# Altium integrated library BearPi_RevB01.IntLib: 39 symbols
Pins are listed as number, name and electrical type; pins without a type are passive.

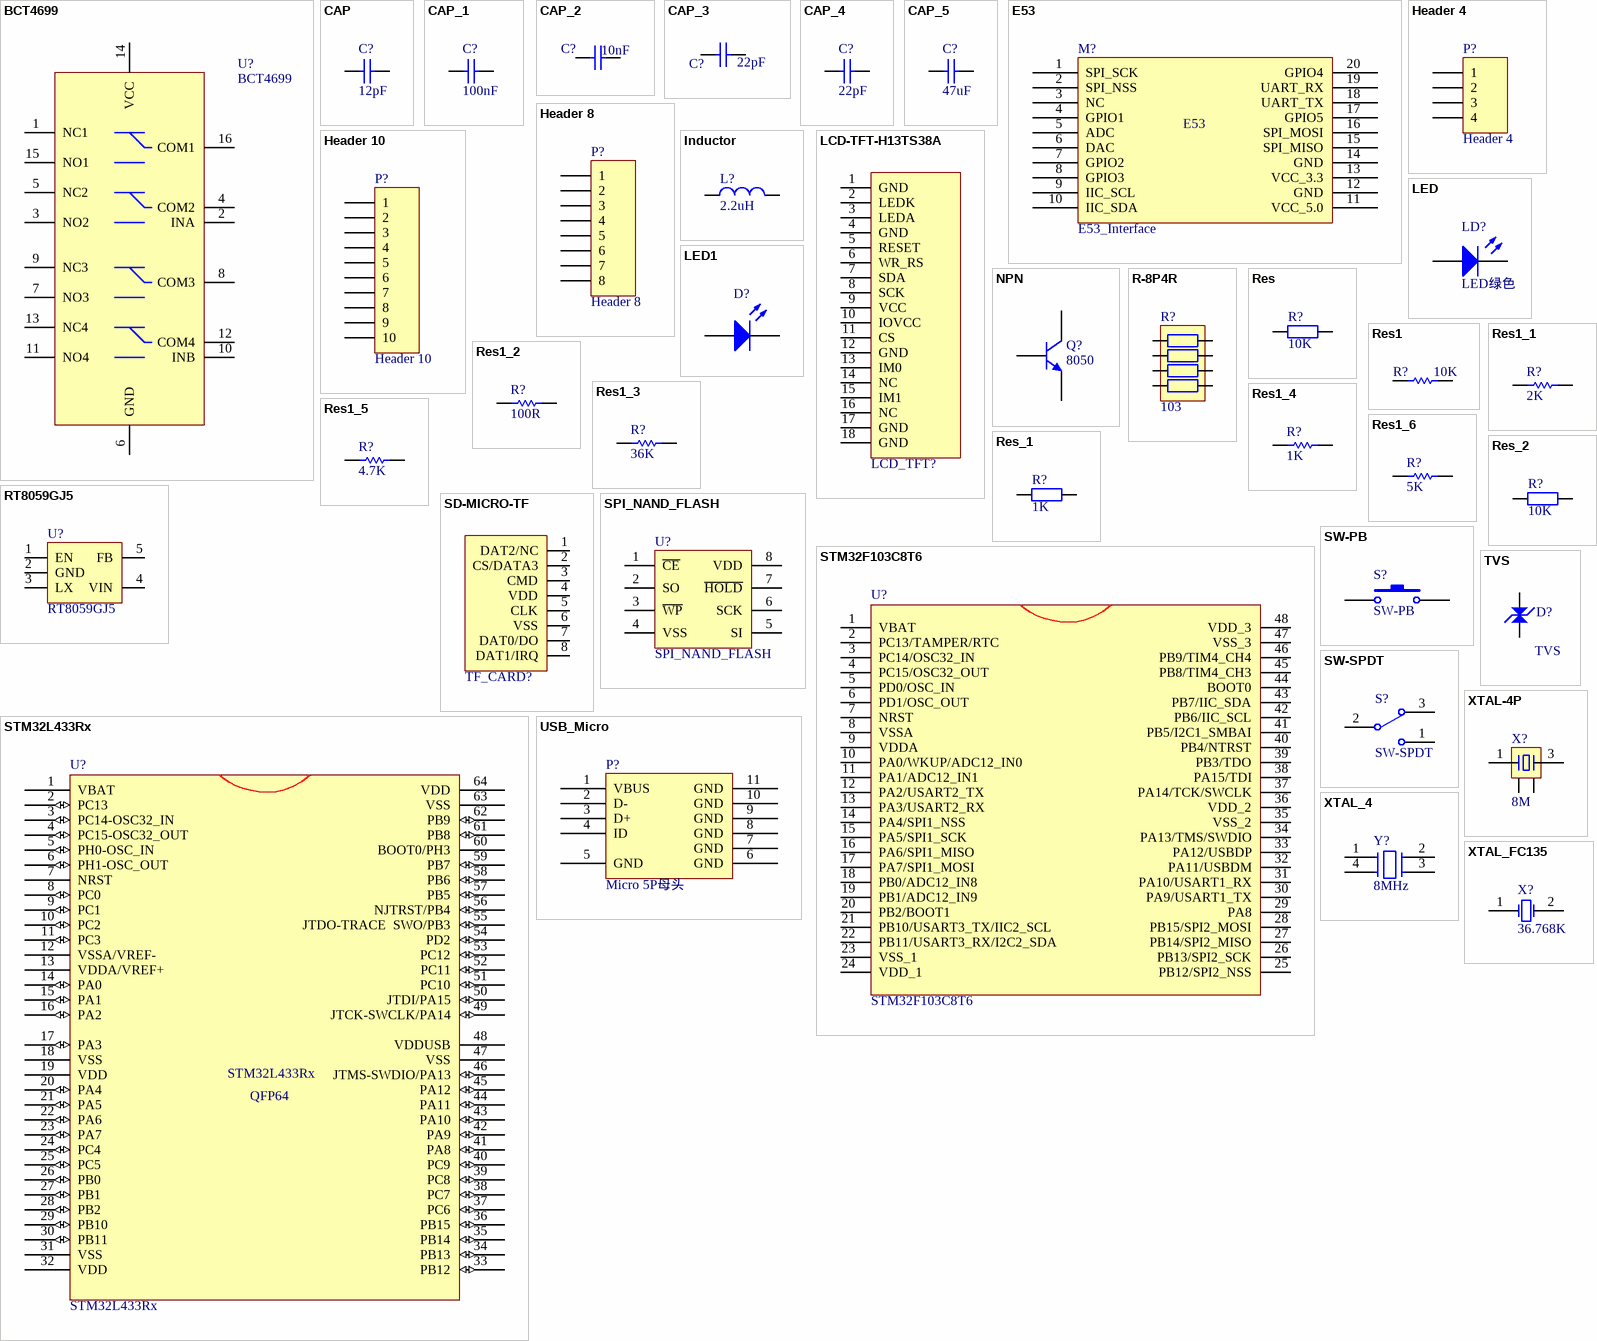
[diagram p0: symbols BCT4699 to XTAL_FC135]

## BCT4699
designator U?
footprint QFN16 (QFN, 16-Leads, Body 3.00x3.00mm, Pitch 0.50mm, Thermal Pad 1.68x1.68mm, IPC Medium Density)
pins: 1 NC1, 2 INA, 3 NO2, 4 COM2, 5 NC2, 6 GND, 7 NO3, 8 COM3, 9 NC3, 10 INB, 11 NO4, 12 COM4, 13 NC4, 14 VCC, 15 NO1, 16 COM1

## CAP
designator C?, comment 12pF
Capacitor
footprint C0603
footprint C0402
footprint C0805
footprint C1206
footprint C1805
footprint CBB_15 (15MM间距)
footprint LC-1206_C
footprint LC-0805_C
footprint CAP_0805
pins: 1, 2

## CAP_1
designator C?, comment 100nF
Capacitor
footprint C0603
footprint C0402
footprint C0805
footprint C1206
footprint C1805
footprint CBB_15 (15MM间距)
footprint LC-1206_C
footprint LC-0805_C
footprint CAP_0805
pins: 1, 2

## CAP_2
designator C?, comment 10nF
Capacitor
footprint C0603
footprint C0402
footprint C0805
footprint C1206
footprint C1805
footprint CBB_15 (15MM间距)
footprint LC-1206_C
footprint LC-0805_C
footprint CAP_0805
pins: 1, 2

## CAP_3
designator C?, comment 22pF
Capacitor
footprint C0603
footprint C0402
footprint C0805
footprint C1206
footprint C1805
footprint CBB_15 (15MM间距)
footprint LC-1206_C
footprint LC-0805_C
footprint CAP_0805
pins: 1, 2

## CAP_4
designator C?, comment 22pF
Capacitor
footprint C0603
footprint C0402
footprint C0805
footprint C1206
footprint C1805
footprint CBB_15 (15MM间距)
footprint LC-1206_C
footprint LC-0805_C
footprint CAP_0805
pins: 1, 2

## CAP_5
designator C?, comment 47uF
Capacitor
footprint C0603
footprint C0402
footprint C0805
footprint C1206
footprint C1805
footprint CBB_15 (15MM间距)
footprint LC-1206_C
footprint LC-0805_C
footprint CAP_0805
pins: 1, 2

## E53
designator M?, comment E53_Interface
footprint EXT_M/H/L
footprint EXT_M_BearPi (一排公对一排母)
pins: 1 SPI_SCK, 2 SPI_NSS, 3 NC, 4 GPIO1, 5 ADC, 6 DAC, 7 GPIO2, 8 GPIO3, 9 IIC_SCL, 10 IIC_SDA, 11 VCC_5.0, 12 GND, 13 VCC_3.3, 14 GND, 15 SPI_MISO, 16 SPI_MOSI, 17 GPIO5, 18 UART_TX, 19 UART_RX, 20 GPIO4

## Header 4
designator P?
Header, 4-Pin; LatestRevisionDate: 17-Jul-2002; LatestRevisionNote: Re-released for DXP Platform.; Publisher: Altium Limited
footprint HDR1X4 (Connector; Header; 4 Position)
signal-integrity model Connector
footprint P4_7.5
footprint P4_5.0
footprint HDR2X4 (Connector; Header; 4 Position)
footprint HDR1.27-LI-4P (排针，4脚)
pins: 1, 2, 3, 4

## Header 8
designator P?
Header, 8-Pin; LatestRevisionDate: 17-Jul-2002; LatestRevisionNote: Re-released for DXP Platform.; Publisher: Altium Limited
footprint HDR1X8 (Connector; Header; 8 Position)
signal-integrity model Connector
footprint HDR2X8 (Connector; Header; 7 Position)
footprint HDR3X8 (Connector; Header; 7 Position)
footprint HDR2.54-M-LI-8P (排母，8脚)
footprint HDR2.54-TP-8P
pins: 1, 2, 3, 4, 5, 6, 7, 8

## Header 10
designator P?
Header, 10-Pin; LatestRevisionDate: 17-Jul-2002; LatestRevisionNote: Re-released for DXP Platform.; Publisher: Altium Limited
footprint HDR1X10 (Connector; Header; 10 Position)
signal-integrity model Connector
footprint P10_9.5
pins: 1, 2, 3, 4, 5, 6, 7, 8, 9, 10

## Inductor
designator L?, comment 2.2uH
Inductor; Code_IEC: 1005; Published: 8-Jun-2000; LatestRevisionDate: 29-May-2009; LatestRevisionNote: IPC-7351 Footprint Added.; PackageReference: 0402-A; Publisher: Altium Limited; PackageDescription: Chip Inductor; Code_JEITA: 0402
simulation model INDUCTOR (Inductor)
signal-integrity model Inductor
footprint I0402
footprint I0603
footprint I0805
footprint CD3x
footprint 4x4 (Inductor;CD42;CD43)
footprint CD7x
footprint CDRH125 (Power Inductor)
footprint I0420
footprint 2520
footprint L 0805 (小功率贴片电感)
footprint NR2520 (2.5mm*2.0mm*1.0mm(长*宽*高）)
pins: 1, 2

## LCD-TFT-H13TS38A
designator LCD_TFT?  (value not drawn)
LCD,TFT,1.3'240*240,禹龙
footprint TFT-H13TS43B (TFT,1.3',240*240)
pins: 1 GND, 2 LEDK, 3 LEDA, 4 GND, 5 RESET, 6 WR_RS, 7 SDA, 8 SCK, 9 VCC, 10 IOVCC, 11 CS, 12 GND, 13 IM0, 14 NC, 15 IM1, 16 NC, 17 GND, 18 GND

## LED
designator LD?, comment LED绿色
LED
footprint LED_0603_R (LED_0603_RED)
footprint LED-3MM
pins: A, K

## LED1
designator D?, comment LED  (value not drawn)
Typical RED GaAs LED; Published: 8-Jun-2000; LatestRevisionDate: 08-Jul-2005; LatestRevisionNote: Mech Layer 1 removed.; PackageReference: LED-1; Publisher: Altium Limited; PackageDescription: LED; 2 Leads
simulation model LED1 (Diode)
footprint LED_0805
footprint LED_0603
footprint LED_A2 (直径3MM二极管)
footprint LC-0603_LED_S2
footprint LED 3MM-B (蓝色3mm直插LED)
footprint LED 3MM-G (绿色3mm直插LED)
footprint LED 3MM-R (红色3mm直插LED)
footprint LED 3MM-W (白色3mm直插LED)
footprint LED 3MM-Y (黄色3mm直插LED)
footprint LED 3MM-YC (橙色3mm直插LED)
footprint LED 1W/3W-W (白色，大功率LED)
pins: 1 A, 2 K

## NPN
designator Q?, comment 8050
NPN Bipolar Transistor; Published: 8-Jun-2000; LatestRevisionDate: 17-Jul-2002; LatestRevisionNote: Re-released for DXP Platform.; PackageReference: TO-226-AA; Publisher: Altium Limited; PackageDescription: TO, Flat Index; 3 In-Line, Axial Leads; Body Dia. 4.8mm; Leads 0.55 x 0.51 mm (max); Code_JEDEC: TO-226-AA
simulation model NPN
signal-integrity model NPN
footprint SOT23_N - 123 (SOT23, 3-Leads, Body 2.9x1.3mm, Pitch 0.95mm, Lead Span 2.3mm - Reverse Pinning, IPC Medium Density)
pins: 1 B, 2 E, 3 C

## R-8P4R
designator R?, comment 103
贴片网络排阻; 版权归属: 源创客; BOM名称: 贴片网络排阻; 学习资源: www.ooocke.com
footprint RCA-8P4R-0402 (2mm*1mm*0.45mm(长*宽*厚))
footprint RCA-8P4R-0603 (3.2mm*1.6mm*0.6mm(长*宽*厚))
pins: 1, 2, 3, 4, 5, 6, 7, 8

## Res
designator R?, comment 10K
Resistor; Value: 1K; Published: 8-Jun-2000; LatestRevisionDate: 17-Jul-2002; LatestRevisionNote: Re-released for DXP Platform.; PackageReference: AXIAL-0.3; Publisher: Altium Limited; PackageDescription: Axial Device, Thru-Hole; 2 Leads; 0.3 in Pin Spacing
footprint R0402
footprint R0805
footprint R0603
footprint R1206
pins: 1, 2

## Res1
designator R?, comment 10K
Resistor; Value: 1K; Published: 8-Jun-2000; LatestRevisionDate: 17-Jul-2002; LatestRevisionNote: Re-released for DXP Platform.; PackageReference: AXIAL-0.3; Publisher: Altium Limited; PackageDescription: Axial Device, Thru-Hole; 2 Leads; 0.3 in Pin Spacing
simulation model RESISTOR (Resistor)
signal-integrity model Res
footprint R0402
footprint R0805
footprint R0603
footprint R1206
footprint LC-2512_R
pins: 1, 2

## Res1_1
designator R?, comment 2K
Resistor; Value: 1K; Published: 8-Jun-2000; LatestRevisionDate: 17-Jul-2002; LatestRevisionNote: Re-released for DXP Platform.; PackageReference: AXIAL-0.3; Publisher: Altium Limited; PackageDescription: Axial Device, Thru-Hole; 2 Leads; 0.3 in Pin Spacing
simulation model RESISTOR (Resistor)
signal-integrity model Res
footprint R0402
footprint R0805
footprint R0603
footprint R1206
footprint LC-2512_R
pins: 1, 2

## Res1_2
designator R?, comment 100R
Resistor; Value: 1K; Published: 8-Jun-2000; LatestRevisionDate: 17-Jul-2002; LatestRevisionNote: Re-released for DXP Platform.; PackageReference: AXIAL-0.3; Publisher: Altium Limited; PackageDescription: Axial Device, Thru-Hole; 2 Leads; 0.3 in Pin Spacing
simulation model RESISTOR (Resistor)
signal-integrity model Res
footprint R0402
footprint R0805
footprint R0603
footprint R1206
footprint LC-2512_R
pins: 1, 2

## Res1_3
designator R?, comment 36K
Resistor; Value: 1K; Published: 8-Jun-2000; LatestRevisionDate: 17-Jul-2002; LatestRevisionNote: Re-released for DXP Platform.; PackageReference: AXIAL-0.3; Publisher: Altium Limited; PackageDescription: Axial Device, Thru-Hole; 2 Leads; 0.3 in Pin Spacing
simulation model RESISTOR (Resistor)
signal-integrity model Res
footprint R0402
footprint R0805
footprint R0603
footprint R1206
footprint LC-2512_R
pins: 1, 2

## Res1_4
designator R?, comment 1K
Resistor; Published: 8-Jun-2000; LatestRevisionDate: 17-Jul-2002; LatestRevisionNote: Re-released for DXP Platform.; PackageReference: AXIAL-0.3; Publisher: Altium Limited; PackageDescription: Axial Device, Thru-Hole; 2 Leads; 0.3 in Pin Spacing; Value: 1K
simulation model RESISTOR (Resistor)
signal-integrity model Res
footprint R0402
footprint R0805
footprint R0603
footprint R1206
footprint LC-2512_R
pins: 1, 2

## Res1_5
designator R?, comment 4.7K
Resistor; Value: 1K; Published: 8-Jun-2000; LatestRevisionDate: 17-Jul-2002; LatestRevisionNote: Re-released for DXP Platform.; PackageReference: AXIAL-0.3; Publisher: Altium Limited; PackageDescription: Axial Device, Thru-Hole; 2 Leads; 0.3 in Pin Spacing
simulation model RESISTOR (Resistor)
signal-integrity model Res
footprint R0402
footprint R0805
footprint R0603
footprint R1206
footprint LC-2512_R
pins: 1, 2

## Res1_6
designator R?, comment 5K
Resistor; Value: 1K; Published: 8-Jun-2000; LatestRevisionDate: 17-Jul-2002; LatestRevisionNote: Re-released for DXP Platform.; PackageReference: AXIAL-0.3; Publisher: Altium Limited; PackageDescription: Axial Device, Thru-Hole; 2 Leads; 0.3 in Pin Spacing
simulation model RESISTOR (Resistor)
signal-integrity model Res
footprint R0402
footprint R0805
footprint R0603
footprint R1206
footprint LC-2512_R
pins: 1, 2

## Res_1
designator R?, comment 1K
Resistor; Published: 8-Jun-2000; LatestRevisionDate: 17-Jul-2002; LatestRevisionNote: Re-released for DXP Platform.; PackageReference: AXIAL-0.3; Publisher: Altium Limited; PackageDescription: Axial Device, Thru-Hole; 2 Leads; 0.3 in Pin Spacing; Value: 1K
footprint R0402
footprint R0805
footprint R0603
footprint R1206
pins: 1, 2

## Res_2
designator R?, comment 10K
Resistor; Value: 1K; Published: 8-Jun-2000; LatestRevisionDate: 17-Jul-2002; LatestRevisionNote: Re-released for DXP Platform.; PackageReference: AXIAL-0.3; Publisher: Altium Limited; PackageDescription: Axial Device, Thru-Hole; 2 Leads; 0.3 in Pin Spacing
footprint R0402
footprint R0805
footprint R0603
footprint R1206
pins: 1, 2

## RT8059GJ5
designator U?
footprint RT8059GJ5
pins: 1 EN, 2 GND, 3 LX, 4 VIN, 5 FB

## SD-MICRO-TF
designator TF_CARD?  (value not drawn)
SD,MICRO,TF
footprint SD-MICRO-TF (TF卡座)
footprint SD-CARD-TF
pins: 1 DAT2/NC, 2 CS/DATA3, 3 CMD, 4 VDD, 5 CLK, 6 VSS, 7 DAT0/DO, 8 DAT1/IRQ

## SPI_NAND_FLASH
designator U?
footprint WSON8 (PQFN, 8-Leads, Body 8.00x6.00mm, Pitch 1.27mm, Thermal Pad 3.38x3.38mm, IPC Medium Density)
footprint SOP-8-V
pins: 1 ~{CE}, 2 SO, 3 ~{WP}, 4 VSS, 5 SI, 6 SCK, 7 ~{HOLD}, 8 VDD

## STM32F103C8T6
designator U?
footprint LQFP48
footprint LQFP48X
footprint LQFP48_PIN
footprint LQFP48_L
pins: 1 VBAT, 2 PC13/TAMPER/RTC, 3 PC14/OSC32_IN, 4 PC15/OSC32_OUT, 5 PD0/OSC_IN, 6 PD1/OSC_OUT, 7 NRST, 8 VSSA, 9 VDDA, 10 PA0/WKUP/ADC12_IN0, 11 PA1/ADC12_IN1, 12 PA2/USART2_TX, 13 PA3/USART2_RX, 14 PA4/SPI1_NSS, 15 PA5/SPI1_SCK, 16 PA6/SPI1_MISO, 17 PA7/SPI1_MOSI, 18 PB0/ADC12_IN8, 19 PB1/ADC12_IN9, 20 PB2/BOOT1, 21 PB10/USART3_TX/IIC2_SCL, 22 PB11/USART3_RX/I2C2_SDA, 23 VSS_1, 24 VDD_1, 25 PB12/SPI2_NSS, 26 PB13/SPI2_SCK, 27 PB14/SPI2_MISO, 28 PB15/SPI2_MOSI, 29 PA8, 30 PA9/USART1_TX, 31 PA10/USART1_RX, 32 PA11/USBDM, 33 PA12/USBDP, 34 PA13/TMS/SWDIO, 35 VSS_2, 36 VDD_2, 37 PA14/TCK/SWCLK, 38 PA15/TDI, 39 PB3/TDO, 40 PB4/NTRST, 41 PB5/I2C1_SMBAI, 42 PB6/IIC_SCL, 43 PB7/IIC_SDA, 44 BOOT0, 45 PB8/TIM4_CH3, 46 PB9/TIM4_CH4, 47 VSS_3, 48 VDD_3

## STM32L433Rx
designator U?
超低功耗高性能ARM Cortex-M4 32-bit MCU+FPU 80MHz 100DMIPS
footprint LQFP64
pins: 1 VBAT, 2 PC13 (io), 3 PC14-OSC32_IN (io), 4 PC15-OSC32_OUT (io), 5 PH0-OSC_IN (io), 6 PH1-OSC_OUT (io), 7 NRST, 8 PC0 (io), 9 PC1 (io), 10 PC2 (io), 11 PC3 (io), 12 VSSA/VREF-, 13 VDDA/VREF+, 14 PA0 (io), 15 PA1 (io), 16 PA2 (io), 17 PA3 (io), 18 VSS, 19 VDD, 20 PA4 (io), 21 PA5 (io), 22 PA6 (io), 23 PA7 (io), 24 PC4 (io), 25 PC5 (io), 26 PB0 (io), 27 PB1 (io), 28 PB2 (io), 29 PB10 (io), 30 PB11 (io), 31 VSS, 32 VDD, 33 PB12 (io), 34 PB13 (io), 35 PB14 (io), 36 PB15 (io), 37 PC6 (io), 38 PC7 (io), 39 PC8 (io), 40 PC9 (io), 41 PA8 (io), 42 PA9 (io), 43 PA10 (io), 44 PA11 (io), 45 PA12 (io), 46 JTMS-SWDIO/PA13 (io), 47 VSS, 48 VDDUSB, 49 JTCK-SWCLK/PA14 (io), 50 JTDI/PA15 (io), 51 PC10 (io), 52 PC11 (io), 53 PC12 (io), 54 PD2 (io), 55 JTDO-TRACE  SWO/PB3 (io), 56 NJTRST/PB4 (io), 57 PB5 (io), 58 PB6 (io), 59 PB7 (io), 60 BOOT0/PH3, 61 PB8 (io), 62 PB9 (io), 63 VSS, 64 VDD
text: QFP64

## SW-PB
designator S?
Switch; Published: 24-Mar-1999; LatestRevisionDate: 17-Jul-2002; LatestRevisionNote: Re-released for DXP Platform.; PackageReference: SPST-2; Publisher: Altium Limited; PackageDescription: Switch; 2 Leads
footprint SWITCH_KEY
footprint KEY-D7
footprint SMD3*6*2.5
footprint SWITCH-3.6
footprint SWITCH_KEY_SMT
footprint TSW 3*6*4.3-S-W (侧立贴片3*6*4.3)
footprint SMD_6X6X4.3
pins: 1, 2

## SW-SPDT
designator S?
SPDT Subminiature Toggle Switch, Right Angle Mounting, Vertical Actuation; Published: 24-Mar-1999; LatestRevisionDate: 17-Dec-2003; LatestRevisionNote: Schematic revised, PCB Footprint replaced.; DatasheetVersion: 05-Dec-2000; PackageReference: TL36WW15050; Publisher: Altium Limited; PackageDescription: Switch; 4 Leads; ComponentLink1Description: Manufacturer Link; ComponentLink1URL: http://www.apem.com
footprint SWITCH_8.5
footprint SS-12D07G3
footprint SWITCH_8.5_SMT
footprint MSK-12C01-07 (6.7*2.8*1.5mm(长宽高）)
pins: 1, 2, 3

## TVS
designator D?
footprint SMA - no pole (DIODE;SS14/DO-214AA)
footprint SMB - no pole (DO-214-AA/SMB; 2 C-Bend Leads; Body 5.3 x 3.6 mm, inc. leads (LxW))
footprint 0603-1 (贴片带丝印)
footprint TVS_0603
pins: 1, 2

## USB_Micro
designator P?, comment Micro 5P母头
footprint USB_Micro (USB Micro-B Connector)
pins: 1 VBUS, 2 D-, 3 D+, 4 ID, 5 GND, 6 GND, 7 GND, 8 GND, 9 GND, 10 GND, 11 GND

## XTAL-4P
designator X?, comment 8M
4脚无源晶振; 版权归属: 源创客; BOM名称: 4脚无源晶振; 学习资源: www.ooocke.com
footprint OSC 1612-4P (1.6*1.2*0.35mm（长宽高）)
footprint OSC 2025-4P (2*2.5*0.55mm(长宽高))
footprint OSC 3225-4P (3.2*2.5*0.7mm(长宽高))
footprint OSC 4025-4P (4*2.5*0.7mm(长宽高))
footprint OSC 5032-4P (5mm*3.2mm*0.8mm(长*宽*高))
footprint OSC 6035-4P (6mm*3.5mm*1mm(长*宽*高))
footprint OSC 7050-4P (7mm*5mm*1.3mm(长*宽*高))
footprint OSC 8045-4P (8mm*4.5mm*1.6mm(长*宽*高))
footprint OSC 8045-4P-C (8mm*4.5mm*1.8mm(长*宽*高))
pins: 1, 2, 3, 4

## XTAL_4
designator Y?, comment 8MHz
XTAL
footprint XTAL_5032
footprint XTAL_3225
pins: 1 IN, 2, 3, 4

## XTAL_FC135
designator X?, comment 36.768K
XTAL
footprint 3215
pins: 1 OSC1, 2 OSC2